# Altium footprint library 6-Connectors-1.PcbLib: 54 footprints (part 3 of 5) (continued)
## HARTING_09 67 015 4754_A [mm] "PCB Edge Mounting Footprint For Straight D-SUB 15 Female Contacts"
height 6
pads (15):
  rect 1.8x4.5 smd paste-2.26: 1(-9.59,0) 2(-6.85,0) 3(-4.11,0) 4(-1.37,0) 5(1.37,0) 6(4.11,0) 7(6.85,0) 8(9.59,0)
  rect 1.8x4.5 smd far side paste-2.26: 9(-8.22,0) 10(-5.48,0) 11(-2.74,0) 12(0,0) 13(2.74,0) 14(5.48,0) 15(8.22,0)
Top Overlay:
  lines w0.2: -13.833,8.928 -13.833,5.928 ccw(c-12.833,5.928) -12.833,4.928 12.833,4.928 ccw(c12.833,5.928) 13.833,5.928 13.833,8.928 ; -12.311,10.028 -12.311,15.128 cw(c-11.511,15.128) -11.511,15.928 11.511,15.928 cw(c11.511,15.128) 12.311,15.128 12.311,10.028 ; -12.3,4.928 -12.3,3.928 -9.89,3.928 ; -9.89,2.65 -9.89,4.928 ; -9.29,2.65 -9.29,4.928 ; -9.29,3.928 -7.15,3.928 ; -8.52,2.65 -8.52,2.928 ; -8.52,3.428 -8.52,3.928 ; -7.92,2.65 -7.92,2.928 ; -7.92,3.428 -7.92,3.928 ; -7.15,2.65 -7.15,4.928 ; -6.55,2.65 -6.55,4.928 ; -6.55,3.928 -4.41,3.928 ; -5.78,2.65 -5.78,2.928 ; -5.78,3.428 -5.78,3.928 ; -5.18,2.65 -5.18,2.928 ; -5.18,3.428 -5.18,3.928 ; -4.41,2.65 -4.41,4.928 ; -3.81,2.65 -3.81,4.928 ; -3.81,3.928 -1.67,3.928 ; -3.04,2.65 -3.04,2.928 ; -3.04,3.428 -3.04,3.928 ; -2.44,2.65 -2.44,2.928 ; -2.44,3.428 -2.44,3.928 ; -1.67,2.65 -1.67,4.928 ; -1.07,2.65 -1.07,4.928 ; -1.07,3.928 1.07,3.928 ; -0.3,2.65 -0.3,2.928 ; -0.3,3.428 -0.3,3.928 ; 0.3,2.65 0.3,2.928 ; 0.3,3.428 0.3,3.928 ; 1.07,2.65 1.07,4.928 ; 1.67,2.65 1.67,4.928 ; 1.67,3.928 3.81,3.928 ; 2.44,2.65 2.44,2.928 ; 2.44,3.428 2.44,3.928 ; 3.04,2.65 3.04,2.928 ; 3.04,3.428 3.04,3.928 ; 3.81,2.65 3.81,4.928 ; 4.41,2.65 4.41,4.928 ; 4.41,3.928 6.55,3.928 ; 5.18,2.65 5.18,2.928 ; 5.18,3.428 5.18,3.928 ; 5.78,2.65 5.78,2.928 ; 5.78,3.428 5.78,3.928 ; 6.55,2.65 6.55,4.928 ; 7.15,2.65 7.15,4.928 ; 7.15,3.928 9.29,3.928 ; 7.92,2.65 7.92,2.928 ; 7.92,3.428 7.92,3.928 ; 8.52,2.65 8.52,2.928 ; 8.52,3.428 8.52,3.928 ; 9.29,2.65 9.29,4.928 ; 9.89,2.65 9.89,4.928 ; 9.89,3.928 12.3,3.928 12.3,4.928 ; -19.75,8.928 19.75,8.928 19.75,10.028 -19.75,10.028 -19.75,8.928
  text "1" at -11.5,-2.2 h1.2
  text "8" at 11.1,-2.3 h1.2
Bottom Overlay:
  lines w0.2: -13.833,8.928 -13.833,5.928 ccw(c-12.833,5.928) -12.833,4.928 12.833,4.928 ccw(c12.833,5.928) 13.833,5.928 13.833,8.928 ; -12.311,10.028 -12.311,15.128 cw(c-11.511,15.128) -11.511,15.928 11.511,15.928 cw(c11.511,15.128) 12.311,15.128 12.311,10.028 ; -12.3,4.928 -12.3,3.928 -8.52,3.928 ; -9.89,2.65 -9.89,2.928 ; -9.89,3.428 -9.89,3.928 ; -9.29,2.65 -9.29,2.928 ; -9.29,3.428 -9.29,3.928 ; -8.52,2.65 -8.52,4.928 ; -7.92,2.65 -7.92,4.928 ; -7.92,3.928 -5.78,3.928 ; -7.15,2.65 -7.15,2.928 ; -7.15,3.428 -7.15,3.928 ; -6.55,2.65 -6.55,2.928 ; -6.55,3.428 -6.55,3.928 ; -5.78,2.65 -5.78,4.928 ; -5.18,2.65 -5.18,4.928 ; -5.18,3.928 -3.04,3.928 ; -4.41,2.65 -4.41,2.928 ; -4.41,3.428 -4.41,3.928 ; -3.81,2.65 -3.81,2.928 ; -3.81,3.428 -3.81,3.928 ; -3.04,2.65 -3.04,4.928 ; -2.44,2.65 -2.44,4.928 ; -2.44,3.928 -0.3,3.928 ; -1.67,2.65 -1.67,2.928 ; -1.67,3.428 -1.67,3.928 ; -1.07,2.65 -1.07,2.928 ; -1.07,3.428 -1.07,3.928 ; -0.3,2.65 -0.3,4.928 ; 0.3,2.65 0.3,4.928 ; 0.3,3.928 2.44,3.928 ; 1.07,2.65 1.07,2.928 ; 1.07,3.428 1.07,3.928 ; 1.67,2.65 1.67,2.928 ; 1.67,3.428 1.67,3.928 ; 2.44,2.65 2.44,4.928 ; 3.04,2.65 3.04,4.928 ; 3.04,3.928 5.18,3.928 ; 3.81,2.65 3.81,2.928 ; 3.81,3.428 3.81,3.928 ; 4.41,2.65 4.41,2.928 ; 4.41,3.428 4.41,3.928 ; 5.18,2.65 5.18,4.928 ; 5.78,2.65 5.78,4.928 ; 5.78,3.928 7.92,3.928 ; 6.55,2.65 6.55,2.928 ; 6.55,3.428 6.55,3.928 ; 7.15,2.65 7.15,2.928 ; 7.15,3.428 7.15,3.928 ; 7.92,2.65 7.92,4.928 ; 8.52,2.65 8.52,4.928 ; 8.52,3.928 12.3,3.928 12.3,4.928 ; 9.29,2.65 9.29,2.928 ; 9.29,3.428 9.29,3.928 ; 9.89,2.65 9.89,2.928 ; 9.89,3.428 9.89,3.928 ; -19.75,8.928 19.75,8.928 19.75,10.028 -19.75,10.028 -19.75,8.928
  text "9" at -9.6,-2.2 h1.2
  text "15" at 11.3,-2.2 h1.2
Mechanical 8:
  lines w0.1: -17.15,9.478 -16.65,9.478 ; -16.65,8.928 -16.65,9.478 ; -16.65,10.028 -16.65,9.478 ; -16.15,9.478 -16.65,9.478 ; -10.09,0 -9.59,0 ; -9.59,-0.5 -9.59,0 ; -9.59,0.5 -9.59,0 ; -9.09,0 -9.59,0 ; -8.72,0 -8.22,0 ; -8.22,-0.5 -8.22,0 ; -8.22,0.5 -8.22,0 ; -7.72,0 -8.22,0 ; -7.35,0 -6.85,0 ; -6.85,-0.5 -6.85,0 ; -6.85,0.5 -6.85,0 ; -6.35,0 -6.85,0 ; -5.98,0 -5.48,0 ; -5.48,-0.5 -5.48,0 ; -5.48,0.5 -5.48,0 ; -4.98,0 -5.48,0 ; -4.61,0 -4.11,0 ; -4.11,-0.5 -4.11,0 ; -4.11,0.5 -4.11,0 ; -3.61,0 -4.11,0 ; -3.24,0 -2.74,0 ; -2.74,-0.5 -2.74,0 ; -2.74,0.5 -2.74,0 ; -2.24,0 -2.74,0 ; -1.87,0 -1.37,0 ; -1.37,-0.5 -1.37,0 ; -1.37,0.5 -1.37,0 ; -0.87,0 -1.37,0 ; -0.5,0 0,0 ; 0,-0.5 0,0 ; 0,0.5 0,0 ; 0.5,0 0,0 ; 0.87,0 1.37,0 ; 1.37,-0.5 1.37,0 ; 1.37,0.5 1.37,0 ; 1.87,0 1.37,0 ; 2.24,0 2.74,0 ; 2.74,-0.5 2.74,0 ; 2.74,0.5 2.74,0 ; 3.24,0 2.74,0 ; 3.61,0 4.11,0 ; 4.11,-0.5 4.11,0 ; 4.11,0.5 4.11,0 ; 4.61,0 4.11,0 ; 4.98,0 5.48,0 ; 5.48,-0.5 5.48,0 ; 5.48,0.5 5.48,0 ; 5.98,0 5.48,0 ; 6.35,0 6.85,0 ; 6.85,-0.5 6.85,0 ; 6.85,0.5 6.85,0 ; 7.35,0 6.85,0 ; 7.72,0 8.22,0 ; 8.22,-0.5 8.22,0 ; 8.22,0.5 8.22,0 ; 8.72,0 8.22,0 ; 9.09,0 9.59,0 ; 9.59,-0.5 9.59,0 ; 9.59,0.5 9.59,0 ; 10.09,0 9.59,0 ; 16.15,9.478 16.65,9.478 ; 16.65,8.928 16.65,9.478 ; 16.65,10.028 16.65,9.478 ; 17.15,9.478 16.65,9.478
Mechanical 14:
  drawing of 155 lines, arcs and shapes, not listed
  text "1" at -11.5,-2.2 h1.2
  text "8" at 11.1,-2.3 h1.2
3D body "p450-180.stp": height 0.02, standoff 0, extent 8.625,-2.25 10.425,2.25
3D body "p450-180.stp": height 0.02, standoff 0, extent 5.958,-2.25 7.758,2.25
3D body "p450-180.stp": height 0.02, standoff 0, extent 3.164,-2.25 4.964,2.25
3D body "p450-180.stp": height 0.02, standoff 0, extent 0.497,-2.25 2.297,2.25
3D body "p450-180.stp": height 0.02, standoff 0, extent -2.297,-2.25 -0.497,2.25
3D body "p450-180.stp": height 0.02, standoff 0, extent -4.964,-2.25 -3.164,2.25
3D body "p450-180.stp": height 0.02, standoff 0, extent -7.758,-2.25 -5.958,2.25
3D body "p450-180.stp": height 0.02, standoff 0, extent -10.552,-2.25 -8.752,2.25
3D body "HARTING_09 67 015 4754_a.stp": height 5.45, standoff -7.05, extent -19.75,-2.072 19.75,15.928

## HARTING_09 67 015 5654 [mm] "Straight D-SUB 15 Male Contacts"
height 12
pads (17):
  round 1.7 hole 1: 1(-9.59,1.42) 2(-6.85,1.42) 3(-4.11,1.42) 4(-1.37,1.42) 5(1.37,1.42) 6(4.11,1.42) 7(6.85,1.42) 8(9.59,1.42) 9(-8.22,-1.42) 10(-5.48,-1.42) 11(-2.74,-1.42) 12(0,-1.42) 13(2.74,-1.42) 14(5.48,-1.42) 15(8.22,-1.42)
  round 5.5 hole 3.2: 16(-16.65,0) 17(16.65,0)
Top Overlay:
  lines w0.2: -19.75,-4.75 ccw(c-18.25,-4.75) -18.25,-6.25 18.25,-6.25 ccw(c18.25,-4.75) 19.75,-4.75 19.75,4.75 ccw(c18.25,4.75) 18.25,6.25 -18.25,6.25 ccw(c-18.25,4.75) -19.75,4.75 -19.75,-4.75 ; -13.153,0.987 cw(c-10.1,1.525) -10.1,4.625 10.1,4.625 cw(c10.1,1.525) 13.153,0.987 12.615,-2.063 cw(c9.562,-1.525) 9.562,-4.625 -9.562,-4.625 cw(c-9.562,-1.525) -12.615,-2.063 -13.153,0.987 ; -12.661,1.074 cw(c-10.1,1.525) -10.1,4.125 10.1,4.125 cw(c10.1,1.525) 12.661,1.074 12.123,-1.976 cw(c9.562,-1.525) 9.562,-4.125 -9.562,-4.125 cw(c-9.562,-1.525) -12.123,-1.976 -12.661,1.074
  text "15" at 9.8,-2.1 h1.2
  text "8" at 11.085,0.873 h1.2
  text "1" at -11.8,0.9 h1.2
  text "9" at -11.4,-2 h1.2
Mechanical 8:
  lines w0.1: -17.15,0 -16.65,0 ; -16.65,-0.5 -16.65,0 ; -16.65,0.5 -16.65,0 ; -16.15,0 -16.65,0 ; -10.09,1.42 -9.59,1.42 ; -9.59,0.92 -9.59,1.42 ; -9.59,1.92 -9.59,1.42 ; -9.09,1.42 -9.59,1.42 ; -8.72,-1.42 -8.22,-1.42 ; -8.22,-1.92 -8.22,-1.42 ; -8.22,-0.92 -8.22,-1.42 ; -7.72,-1.42 -8.22,-1.42 ; -7.35,1.42 -6.85,1.42 ; -6.85,0.92 -6.85,1.42 ; -6.85,1.92 -6.85,1.42 ; -6.35,1.42 -6.85,1.42 ; -5.98,-1.42 -5.48,-1.42 ; -5.48,-1.92 -5.48,-1.42 ; -5.48,-0.92 -5.48,-1.42 ; -4.98,-1.42 -5.48,-1.42 ; -4.61,1.42 -4.11,1.42 ; -4.11,0.92 -4.11,1.42 ; -4.11,1.92 -4.11,1.42 ; -3.61,1.42 -4.11,1.42 ; -3.24,-1.42 -2.74,-1.42 ; -2.74,-1.92 -2.74,-1.42 ; -2.74,-0.92 -2.74,-1.42 ; -2.24,-1.42 -2.74,-1.42 ; -1.87,1.42 -1.37,1.42 ; -1.37,0.92 -1.37,1.42 ; -1.37,1.92 -1.37,1.42 ; -0.87,1.42 -1.37,1.42 ; -0.5,-1.42 0,-1.42 ; -0.5,0 0,0 ; 0,-1.92 0,-1.42 ; 0,-0.92 0,-1.42 ; 0,-0.5 0,0 ; 0,0.5 0,0 ; 0.5,-1.42 0,-1.42 ; 0.5,0 0,0 ; 0.87,1.42 1.37,1.42 ; 1.37,0.92 1.37,1.42 ; 1.37,1.92 1.37,1.42 ; 1.87,1.42 1.37,1.42 ; 2.24,-1.42 2.74,-1.42 ; 2.74,-1.92 2.74,-1.42 ; 2.74,-0.92 2.74,-1.42 ; 3.24,-1.42 2.74,-1.42 ; 3.61,1.42 4.11,1.42 ; 4.11,0.92 4.11,1.42 ; 4.11,1.92 4.11,1.42 ; 4.61,1.42 4.11,1.42 ; 4.98,-1.42 5.48,-1.42 ; 5.48,-1.92 5.48,-1.42 ; 5.48,-0.92 5.48,-1.42 ; 5.98,-1.42 5.48,-1.42 ; 6.35,1.42 6.85,1.42 ; 6.85,0.92 6.85,1.42 ; 6.85,1.92 6.85,1.42 ; 7.35,1.42 6.85,1.42 ; 7.72,-1.42 8.22,-1.42 ; 8.22,-1.92 8.22,-1.42 ; 8.22,-0.92 8.22,-1.42 ; 8.72,-1.42 8.22,-1.42 ; 9.09,1.42 9.59,1.42 ; 9.59,0.92 9.59,1.42 ; 9.59,1.92 9.59,1.42 ; 10.09,1.42 9.59,1.42 ; 16.15,0 16.65,0 ; 16.65,-0.5 16.65,0 ; 16.65,0.5 16.65,0 ; 17.15,0 16.65,0
Mechanical 14:
  circle w0.1: c-8.22,-1.42 r0.55
  circle w0.1: c-5.48,-1.42 r0.55
  circle w0.1: c-2.74,-1.42 r0.55
  circle w0.1: c0,-1.42 r0.55
  circle w0.1: c2.74,-1.42 r0.55
  circle w0.1: c5.48,-1.42 r0.55
  circle w0.1: c8.22,-1.42 r0.55
  circle w0.1: c9.59,1.42 r0.55
  circle w0.1: c6.85,1.42 r0.55
  circle w0.1: c4.11,1.42 r0.55
  circle w0.1: c1.37,1.42 r0.55
  circle w0.1: c-1.37,1.42 r0.55
  circle w0.1: c-4.11,1.42 r0.55
  circle w0.1: c-6.85,1.42 r0.55
  circle w0.1: c-9.59,1.42 r0.55
  circle w0.1: c16.65,0 r1.55
  circle w0.1: c-16.65,0 r1.55
  lines w0.1: -19.75,-4.75 ccw(c-18.25,-4.75) -18.25,-6.25 18.25,-6.25 ccw(c18.25,-4.75) 19.75,-4.75 19.75,4.75 ccw(c18.25,4.75) 18.25,6.25 -18.25,6.25 ccw(c-18.25,4.75) -19.75,4.75 -19.75,-4.75 ; -13.153,0.987 cw(c-10.1,1.525) -10.1,4.625 10.1,4.625 cw(c10.1,1.525) 13.153,0.987 12.615,-2.063 cw(c9.562,-1.525) 9.562,-4.625 -9.562,-4.625 cw(c-9.562,-1.525) -12.615,-2.063 -13.153,0.987 ; -12.661,1.074 cw(c-10.1,1.525) -10.1,4.125 10.1,4.125 cw(c10.1,1.525) 12.661,1.074 12.123,-1.976 cw(c9.562,-1.525) 9.562,-4.125 -9.562,-4.125 cw(c-9.562,-1.525) -12.123,-1.976 -12.661,1.074
  text "9" at -11.4,-2 h1.2
  text "1" at -11.8,0.9 h1.2
  text "8" at 11.085,0.873 h1.2
  text "15" at 9.8,-2.1 h1.2
3D body "HARTING_09 67 015 5654.stp": height 12, standoff -6, extent -19.75,-6.25 19.75,6.25

## HARTING_09 67 015 5654_A [mm] "PCB Edge Mounting Footprint For Straight D-SUB 15 Male Contacts"
height 6
pads (15):
  rect 1.8x4.5 smd paste-2.26: 1(9.59,0) 2(6.85,0) 3(4.11,0) 4(1.37,0) 5(-1.37,0) 6(-4.11,0) 7(-6.85,0) 8(-9.59,0)
  rect 1.8x4.5 smd far side paste-2.26: 9(8.22,0) 10(5.48,0) 11(2.74,0) 12(0,0) 13(-2.74,0) 14(-5.48,0) 15(-8.22,0)
Top Overlay:
  lines w0.2: -13.833,8.928 -13.833,5.928 ccw(c-12.833,5.928) -12.833,4.928 12.833,4.928 ccw(c12.833,5.928) 13.833,5.928 13.833,8.928 ; -13.153,10.028 -13.153,15.128 cw(c-12.353,15.128) -12.353,15.928 12.353,15.928 cw(c12.353,15.128) 13.153,15.128 13.153,10.028 ; -12.3,4.928 -12.3,3.928 -9.89,3.928 ; -9.89,2.65 -9.89,4.928 ; -9.29,2.65 -9.29,4.928 ; -9.29,3.928 -7.15,3.928 ; -8.52,2.65 -8.52,2.928 ; -8.52,3.428 -8.52,3.928 ; -7.92,2.65 -7.92,2.928 ; -7.92,3.428 -7.92,3.928 ; -7.15,2.65 -7.15,4.928 ; -6.55,2.65 -6.55,4.928 ; -6.55,3.928 -4.41,3.928 ; -5.78,2.65 -5.78,2.928 ; -5.78,3.428 -5.78,3.928 ; -5.18,2.65 -5.18,2.928 ; -5.18,3.428 -5.18,3.928 ; -4.41,2.65 -4.41,4.928 ; -3.81,2.65 -3.81,4.928 ; -3.81,3.928 -1.67,3.928 ; -3.04,2.65 -3.04,2.928 ; -3.04,3.428 -3.04,3.928 ; -2.44,2.65 -2.44,2.928 ; -2.44,3.428 -2.44,3.928 ; -1.67,2.65 -1.67,4.928 ; -1.07,2.65 -1.07,4.928 ; -1.07,3.928 1.07,3.928 ; -0.3,2.65 -0.3,2.928 ; -0.3,3.428 -0.3,3.928 ; 0.3,2.65 0.3,2.928 ; 0.3,3.428 0.3,3.928 ; 1.07,2.65 1.07,4.928 ; 1.67,2.65 1.67,4.928 ; 1.67,3.928 3.81,3.928 ; 2.44,2.65 2.44,2.928 ; 2.44,3.428 2.44,3.928 ; 3.04,2.65 3.04,2.928 ; 3.04,3.428 3.04,3.928 ; 3.81,2.65 3.81,4.928 ; 4.41,2.65 4.41,4.928 ; 4.41,3.928 6.55,3.928 ; 5.18,2.65 5.18,2.928 ; 5.18,3.428 5.18,3.928 ; 5.78,2.65 5.78,2.928 ; 5.78,3.428 5.78,3.928 ; 6.55,2.65 6.55,4.928 ; 7.15,2.65 7.15,4.928 ; 7.15,3.928 9.29,3.928 ; 7.92,2.65 7.92,2.928 ; 7.92,3.428 7.92,3.928 ; 8.52,2.65 8.52,2.928 ; 8.52,3.428 8.52,3.928 ; 9.29,2.65 9.29,4.928 ; 9.89,2.65 9.89,4.928 ; 9.89,3.928 12.3,3.928 12.3,4.928 ; -19.75,8.928 -19.75,10.028 19.75,10.028 19.75,8.928 -19.75,8.928
  text "1" at 11.1,-2.3 h1.2
  text "8" at -11.5,-2.2 h1.2
Bottom Overlay:
  lines w0.2: -13.833,8.928 -13.833,5.928 ccw(c-12.833,5.928) -12.833,4.928 12.833,4.928 ccw(c12.833,5.928) 13.833,5.928 13.833,8.928 ; -13.153,10.028 -13.153,15.128 cw(c-12.353,15.128) -12.353,15.928 12.353,15.928 cw(c12.353,15.128) 13.153,15.128 13.153,10.028 ; -12.3,4.928 -12.3,3.928 -8.52,3.928 ; -9.89,2.65 -9.89,2.928 ; -9.89,3.428 -9.89,3.928 ; -9.29,2.65 -9.29,2.928 ; -9.29,3.428 -9.29,3.928 ; -8.52,2.65 -8.52,4.928 ; -7.92,2.65 -7.92,4.928 ; -7.92,3.928 -5.78,3.928 ; -7.15,2.65 -7.15,2.928 ; -7.15,3.428 -7.15,3.928 ; -6.55,2.65 -6.55,2.928 ; -6.55,3.428 -6.55,3.928 ; -5.78,2.65 -5.78,4.928 ; -5.18,2.65 -5.18,4.928 ; -5.18,3.928 -3.04,3.928 ; -4.41,2.65 -4.41,2.928 ; -4.41,3.428 -4.41,3.928 ; -3.81,2.65 -3.81,2.928 ; -3.81,3.428 -3.81,3.928 ; -3.04,2.65 -3.04,4.928 ; -2.44,2.65 -2.44,4.928 ; -2.44,3.928 -0.3,3.928 ; -1.67,2.65 -1.67,2.928 ; -1.67,3.428 -1.67,3.928 ; -1.07,2.65 -1.07,2.928 ; -1.07,3.428 -1.07,3.928 ; -0.3,2.65 -0.3,4.928 ; 0.3,2.65 0.3,4.928 ; 0.3,3.928 2.44,3.928 ; 1.07,2.65 1.07,2.928 ; 1.07,3.428 1.07,3.928 ; 1.67,2.65 1.67,2.928 ; 1.67,3.428 1.67,3.928 ; 2.44,2.65 2.44,4.928 ; 3.04,2.65 3.04,4.928 ; 3.04,3.928 5.18,3.928 ; 3.81,2.65 3.81,2.928 ; 3.81,3.428 3.81,3.928 ; 4.41,2.65 4.41,2.928 ; 4.41,3.428 4.41,3.928 ; 5.18,2.65 5.18,4.928 ; 5.78,2.65 5.78,4.928 ; 5.78,3.928 7.92,3.928 ; 6.55,2.65 6.55,2.928 ; 6.55,3.428 6.55,3.928 ; 7.15,2.65 7.15,2.928 ; 7.15,3.428 7.15,3.928 ; 7.92,2.65 7.92,4.928 ; 8.52,2.65 8.52,4.928 ; 8.52,3.928 12.3,3.928 12.3,4.928 ; 9.29,2.65 9.29,2.928 ; 9.29,3.428 9.29,3.928 ; 9.89,2.65 9.89,2.928 ; 9.89,3.428 9.89,3.928 ; -19.75,8.928 -19.75,10.028 19.75,10.028 19.75,8.928 -19.75,8.928
  text "9" at 10.4,-2.2 h1.2
  text "15" at -9.6,-2.2 h1.2
Mechanical 8:
  lines w0.1: -17.15,9.478 -16.65,9.478 ; -16.65,8.928 -16.65,9.478 ; -16.65,10.028 -16.65,9.478 ; -16.15,9.478 -16.65,9.478 ; -10.09,0 -9.59,0 ; -9.59,-0.5 -9.59,0 ; -9.59,0.5 -9.59,0 ; -9.09,0 -9.59,0 ; -8.72,0 -8.22,0 ; -8.22,-0.5 -8.22,0 ; -8.22,0.5 -8.22,0 ; -7.72,0 -8.22,0 ; -7.35,0 -6.85,0 ; -6.85,-0.5 -6.85,0 ; -6.85,0.5 -6.85,0 ; -6.35,0 -6.85,0 ; -5.98,0 -5.48,0 ; -5.48,-0.5 -5.48,0 ; -5.48,0.5 -5.48,0 ; -4.98,0 -5.48,0 ; -4.61,0 -4.11,0 ; -4.11,-0.5 -4.11,0 ; -4.11,0.5 -4.11,0 ; -3.61,0 -4.11,0 ; -3.24,0 -2.74,0 ; -2.74,-0.5 -2.74,0 ; -2.74,0.5 -2.74,0 ; -2.24,0 -2.74,0 ; -1.87,0 -1.37,0 ; -1.37,-0.5 -1.37,0 ; -1.37,0.5 -1.37,0 ; -0.87,0 -1.37,0 ; -0.5,0 0,0 ; 0,-0.5 0,0 ; 0,0.5 0,0 ; 0.5,0 0,0 ; 0.87,0 1.37,0 ; 1.37,-0.5 1.37,0 ; 1.37,0.5 1.37,0 ; 1.87,0 1.37,0 ; 2.24,0 2.74,0 ; 2.74,-0.5 2.74,0 ; 2.74,0.5 2.74,0 ; 3.24,0 2.74,0 ; 3.61,0 4.11,0 ; 4.11,-0.5 4.11,0 ; 4.11,0.5 4.11,0 ; 4.61,0 4.11,0 ; 4.98,0 5.48,0 ; 5.48,-0.5 5.48,0 ; 5.48,0.5 5.48,0 ; 5.98,0 5.48,0 ; 6.35,0 6.85,0 ; 6.85,-0.5 6.85,0 ; 6.85,0.5 6.85,0 ; 7.35,0 6.85,0 ; 7.72,0 8.22,0 ; 8.22,-0.5 8.22,0 ; 8.22,0.5 8.22,0 ; 8.72,0 8.22,0 ; 9.09,0 9.59,0 ; 9.59,-0.5 9.59,0 ; 9.59,0.5 9.59,0 ; 10.09,0 9.59,0 ; 16.15,9.478 16.65,9.478 ; 16.65,8.928 16.65,9.478 ; 16.65,10.028 16.65,9.478 ; 17.15,9.478 16.65,9.478
Mechanical 14:
  drawing of 155 lines, arcs and shapes, not listed
  text "1" at 11.1,-2.3 h1.2
  text "8" at -11.5,-2.2 h1.2
3D body "p450-180.stp": height 0.02, standoff 0, extent 8.752,-2.25 10.552,2.25
3D body "p450-180.stp": height 0.02, standoff 0, extent 5.958,-2.25 7.758,2.25
3D body "p450-180.stp": height 0.02, standoff 0, extent 3.164,-2.25 4.964,2.25
3D body "p450-180.stp": height 0.02, standoff 0, extent 0.497,-2.25 2.297,2.25
3D body "p450-180.stp": height 0.02, standoff 0, extent -2.297,-2.25 -0.497,2.25
3D body "p450-180.stp": height 0.02, standoff 0, extent -4.964,-2.25 -3.164,2.25
3D body "p450-180.stp": height 0.02, standoff 0, extent -7.758,-2.25 -5.958,2.25
3D body "p450-180.stp": height 0.02, standoff 0, extent -10.552,-2.25 -8.752,2.25
3D body "HARTING_09 67 015 5654_a.stp": height 5.45, standoff -7.05, extent -19.75,-2.072 19.75,15.928

## HARTING_09 73 264 6801 [mm] "Connector; DIN 41612, Har-Bus Type R, Thru-Hole; Rows a+c, 64 Position; Right Angle"
height 9.5
pads (66):
  round 1.7 hole 1: a1(0,0) a2(0,-2.54) a3(0,-5.08) a4(0,-7.62) a5(0,-10.16) a6(0,-12.7) a7(0,-15.24) a8(0,-17.78) a9(0,-20.32) a10(0,-22.86) a11(0,-25.4) a12(0,-27.94) a13(0,-30.48) a14(0,-33.02) a15(0,-35.56) a16(0,-38.1) a17(0,-40.64) a18(0,-43.18) a19(0,-45.72) a20(0,-48.26) a21(0,-50.8) a22(0,-53.34) a23(0,-55.88) a24(0,-58.42) a25(0,-60.96) a26(0,-63.5) a27(0,-66.04) a28(0,-68.58) a29(0,-71.12) a30(0,-73.66) a31(0,-76.2) a32(0,-78.74) c1(-5.08,0) c2(-5.08,-2.54) c3(-5.08,-5.08) c4(-5.08,-7.62) c5(-5.08,-10.16) c6(-5.08,-12.7) c7(-5.08,-15.24) c8(-5.08,-17.78) c9(-5.08,-20.32) c10(-5.08,-22.86) c11(-5.08,-25.4) c12(-5.08,-27.94) c13(-5.08,-30.48) c14(-5.08,-33.02) c15(-5.08,-35.56) c16(-5.08,-38.1) c17(-5.08,-40.64) c18(-5.08,-43.18) c19(-5.08,-45.72) c20(-5.08,-48.26) c21(-5.08,-50.8) c22(-5.08,-53.34) c23(-5.08,-55.88) c24(-5.08,-58.42) c25(-5.08,-60.96) c26(-5.08,-63.5) c27(-5.08,-66.04) c28(-5.08,-68.58) c29(-5.08,-71.12) c30(-5.08,-73.66) c31(-5.08,-76.2) c32(-5.08,-78.74)
  round 3.5 / inner round 3.5 / far side round 5.1 hole 2.8: MTG1(2.54,5.08) MTG2(2.54,-83.82)
Top Overlay:
  lines w0.2: 1.738,-86.32 0.01,-86.32 0.01,-81.395 1.14,-81.395 1.14,2.655 0.01,2.655 0.01,7.58 1.738,7.58 ; 3.556,-86.32 6.14,-86.32 6.14,-84.003 6.14,5.263 6.14,7.58 3.556,7.58 ; 6.14,-81.845 12.06,-81.845 ; 6.14,-80.795 6.77,-80.795 12.06,-80.795 ; 6.14,2.055 6.77,2.055 12.06,2.055 ; 6.14,3.105 12.06,3.105 ; 12.06,-81.845 12.69,-81.215 12.69,-80.165 ; 12.06,-81.845 12.06,-80.795 ; 12.06,-80.795 12.69,-80.165 ; 12.06,-80.795 12.06,2.055 ; 12.06,2.055 12.69,1.425 ; 12.06,2.055 12.06,3.105 ; 12.06,3.105 12.69,2.475 12.69,1.425 ; 12.69,-80.165 12.69,1.425
  text "20" at -8.12,-48.835 h1.2
  text "15" at -8.02,-36.235 h1.2
  text "a" at -0.6,2.04 h1.2
  text "c" at -4.58,2.04 h1.2
  text "25" at -8.1,-61.6 h1.2
  text "32" at -8.12,-79.315 h1.2
  text "10" at -8.02,-23.535 h1.2
  text "30" at -8.12,-74.235 h1.2
  text "1" at -6.695,-0.725 h1.2
  text "5" at -6.895,-10.785 h1.2
Mechanical 8:
  lines w0.1: -5.08,-39.37 12.64,-39.37 ; 5.3,-86.3 5.3,7.5
Mechanical 14:
  circle w0.1: c2.54,-83.82 r1.4
  circle w0.1: c2.54,5.08 r1.4
  lines w0.1: 1.14,-77.97 5.59,-77.97 ; 1.14,-76.97 5.59,-76.97 ; 1.14,-52.57 5.59,-52.57 ; 1.14,-51.57 5.59,-51.57 ; 1.14,-27.17 5.59,-27.17 ; 1.14,-26.17 5.59,-26.17 ; 1.14,-1.77 5.59,-1.77 ; 1.14,-0.77 5.59,-0.77 ; 1.297,5.08 2.54,5.08 ; 6.14,-81.845 12.06,-81.845 ; 6.14,-80.795 6.77,-80.795 ; 6.14,2.055 6.77,2.055 ; 6.14,3.105 12.06,3.105 ; 1.14,-81.395 1.14,2.655 ; 1.14,-81.395 4.084,-81.395 5.59,-84.003 ; 1.14,-81.395 0.01,-81.395 0.01,-86.32 6.14,-86.32 6.14,-84.003 ; 1.14,2.655 4.084,2.655 5.59,5.263 ; 1.14,2.655 0.01,2.655 0.01,7.58 6.14,7.58 6.14,5.263 ; 5.59,-84.003 5.59,-77.72 1.69,-77.72 1.69,-77.22 5.59,-77.22 5.59,-52.32 1.69,-52.32 1.69,-51.82 5.59,-51.82 5.59,-26.92 1.69,-26.92 1.69,-26.42 5.59,-26.42 5.59,-1.52 1.69,-1.52 1.69,-1.02 5.59,-1.02 5.59,5.263 ; 5.59,-84.003 6.14,-84.003 ; 5.59,5.263 6.14,5.263 ; 6.14,-84.003 6.14,5.263 ; 6.77,-80.795 12.06,-80.795 ; 6.77,-80.795 6.77,2.055 ; 6.77,2.055 12.06,2.055 ; 12.06,-81.845 12.69,-81.215 12.69,-80.165 ; 12.06,-81.845 12.06,-80.795 ; 12.06,-80.795 12.69,-80.165 ; 12.06,-80.795 12.06,2.055 ; 12.06,2.055 12.69,1.425 ; 12.06,2.055 12.06,3.105 ; 12.06,3.105 12.69,2.475 12.69,1.425 ; 12.69,-80.165 12.69,1.425
  text "a" at -0.6,2.04 h1.2
  text "c" at -4.58,2.04 h1.2
  text "30" at -8.12,-74.235 h1.2
  text "20" at -8.12,-48.835 h1.2
  text "15" at -8.02,-36.235 h1.2
  text "32" at -8.12,-79.315 h1.2
  text "1" at -6.695,-0.725 h1.2
  text "25" at -8.1,-61.6 h1.2
  text "10" at -8.02,-23.535 h1.2
  text "5" at -6.895,-10.785 h1.2
3D body "v160-080.stp": height 0.02, standoff -1.65, extent -0.8,-79.54 0.8,-77.94
3D body "v160-080.stp": height 0.02, standoff -1.65, extent -5.88,-79.54 -4.28,-77.94
3D body "v160-080.stp": height 0.02, standoff -1.65, extent -0.8,-77 0.8,-75.4
3D body "v160-080.stp": height 0.02, standoff -1.65, extent -5.88,-77 -4.28,-75.4
3D body "v160-080.stp": height 0.02, standoff -1.65, extent -0.8,-74.46 0.8,-72.86
3D body "v160-080.stp": height 0.02, standoff -1.65, extent -5.88,-74.46 -4.28,-72.86
3D body "v160-080.stp": height 0.02, standoff -1.65, extent -0.8,-71.92 0.8,-70.32
3D body "v160-080.stp": height 0.02, standoff -1.65, extent -5.88,-71.92 -4.28,-70.32
3D body "v160-080.stp": height 0.02, standoff -1.65, extent -0.8,-69.38 0.8,-67.78
3D body "v160-080.stp": height 0.02, standoff -1.65, extent -5.88,-69.38 -4.28,-67.78
3D body "v160-080.stp": height 0.02, standoff -1.65, extent -0.8,-66.84 0.8,-65.24
3D body "v160-080.stp": height 0.02, standoff -1.65, extent -5.88,-66.84 -4.28,-65.24
3D body "v160-080.stp": height 0.02, standoff -1.65, extent -0.8,-64.3 0.8,-62.7
3D body "v160-080.stp": height 0.02, standoff -1.65, extent -5.88,-64.3 -4.28,-62.7
3D body "v160-080.stp": height 0.02, standoff -1.65, extent -0.8,-61.76 0.8,-60.16
3D body "v160-080.stp": height 0.02, standoff -1.65, extent -5.88,-61.76 -4.28,-60.16
3D body "v160-080.stp": height 0.02, standoff -1.65, extent -0.8,-59.22 0.8,-57.62
3D body "v160-080.stp": height 0.02, standoff -1.65, extent -5.88,-59.22 -4.28,-57.62
3D body "v160-080.stp": height 0.02, standoff -1.65, extent -0.8,-56.68 0.8,-55.08
3D body "v160-080.stp": height 0.02, standoff -1.65, extent -5.88,-56.68 -4.28,-55.08
3D body "v160-080.stp": height 0.02, standoff -1.65, extent -0.8,-54.14 0.8,-52.54
3D body "v160-080.stp": height 0.02, standoff -1.65, extent -5.88,-54.14 -4.28,-52.54
3D body "v160-080.stp": height 0.02, standoff -1.65, extent -0.8,-51.6 0.8,-50
3D body "v160-080.stp": height 0.02, standoff -1.65, extent -5.88,-51.6 -4.28,-50
3D body "v160-080.stp": height 0.02, standoff -1.65, extent -0.8,-49.06 0.8,-47.46
3D body "v160-080.stp": height 0.02, standoff -1.65, extent -5.88,-49.06 -4.28,-47.46
3D body "v160-080.stp": height 0.02, standoff -1.65, extent -0.8,-46.52 0.8,-44.92
3D body "v160-080.stp": height 0.02, standoff -1.65, extent -5.88,-46.52 -4.28,-44.92
3D body "v160-080.stp": height 0.02, standoff -1.65, extent -0.8,-43.98 0.8,-42.38
3D body "v160-080.stp": height 0.02, standoff -1.65, extent -5.88,-43.98 -4.28,-42.38
3D body "v160-080.stp": height 0.02, standoff -1.65, extent -0.8,-41.44 0.8,-39.84
3D body "v160-080.stp": height 0.02, standoff -1.65, extent -5.88,-41.44 -4.28,-39.84
3D body "v160-080.stp": height 0.02, standoff -1.65, extent -0.8,-38.9 0.8,-37.3
3D body "v160-080.stp": height 0.02, standoff -1.65, extent -5.88,-38.9 -4.28,-37.3
3D body "v160-080.stp": height 0.02, standoff -1.65, extent -0.8,-36.36 0.8,-34.76
3D body "v160-080.stp": height 0.02, standoff -1.65, extent -5.88,-36.36 -4.28,-34.76
3D body "v160-080.stp": height 0.02, standoff -1.65, extent -0.8,-33.82 0.8,-32.22
3D body "v160-080.stp": height 0.02, standoff -1.65, extent -5.88,-33.82 -4.28,-32.22
3D body "v160-080.stp": height 0.02, standoff -1.65, extent -0.8,-31.28 0.8,-29.68
3D body "v160-080.stp": height 0.02, standoff -1.65, extent -5.88,-31.28 -4.28,-29.68
3D body "v160-080.stp": height 0.02, standoff -1.65, extent -0.8,-28.74 0.8,-27.14
3D body "v160-080.stp": height 0.02, standoff -1.65, extent -5.88,-28.74 -4.28,-27.14
3D body "v160-080.stp": height 0.02, standoff -1.65, extent -0.8,-26.2 0.8,-24.6
3D body "v160-080.stp": height 0.02, standoff -1.65, extent -5.88,-26.2 -4.28,-24.6
3D body "v160-080.stp": height 0.02, standoff -1.65, extent -0.8,-23.66 0.8,-22.06
3D body "v160-080.stp": height 0.02, standoff -1.65, extent -5.88,-23.66 -4.28,-22.06
3D body "v160-080.stp": height 0.02, standoff -1.65, extent -0.8,-21.12 0.8,-19.52
3D body "v160-080.stp": height 0.02, standoff -1.65, extent -5.88,-21.12 -4.28,-19.52
3D body "v160-080.stp": height 0.02, standoff -1.65, extent -0.8,-18.58 0.8,-16.98
3D body "v160-080.stp": height 0.02, standoff -1.65, extent -5.88,-18.58 -4.28,-16.98
3D body "v160-080.stp": height 0.02, standoff -1.65, extent -0.8,-16.04 0.8,-14.44
3D body "v160-080.stp": height 0.02, standoff -1.65, extent -5.88,-16.04 -4.28,-14.44
3D body "v160-080.stp": height 0.02, standoff -1.65, extent -0.8,-13.5 0.8,-11.9
3D body "v160-080.stp": height 0.02, standoff -1.65, extent -5.88,-13.5 -4.28,-11.9
3D body "v160-080.stp": height 0.02, standoff -1.65, extent -0.8,-10.96 0.8,-9.36
3D body "v160-080.stp": height 0.02, standoff -1.65, extent -5.88,-10.96 -4.28,-9.36
3D body "v160-080.stp": height 0.02, standoff -1.65, extent -0.8,-8.42 0.8,-6.82
3D body "v160-080.stp": height 0.02, standoff -1.65, extent -5.88,-8.42 -4.28,-6.82
3D body "v160-080.stp": height 0.02, standoff -1.65, extent -0.8,-5.88 0.8,-4.28
3D body "v160-080.stp": height 0.02, standoff -1.65, extent -5.88,-5.88 -4.28,-4.28
3D body "v160-080.stp": height 0.02, standoff -1.65, extent -0.8,-3.34 0.8,-1.74
3D body "v160-080.stp": height 0.02, standoff -1.65, extent -5.88,-3.34 -4.28,-1.74
3D body "v160-080.stp": height 0.02, standoff -1.65, extent -0.8,-0.8 0.8,0.8
3D body "v160-080.stp": height 0.02, standoff -1.65, extent -5.88,-0.8 -4.28,0.8
3D body "HARTING_09 73 264 6801.stp": height 9.1, standoff -3, extent -5.38,-86.37 12.74,7.63